# Altium footprint library WARG.PcbLib: 58 footprints (part 2 of 4)
Each footprint in its own frame and in the unit in brackets; x right, y up, seen from the top. Pads: shape width x height; smd on the part's side, far side on the other; paste and mask are expansions set on the pad; w line width, h text height; cw(c..) or ccw(c..) is an arc to the next point about the centre after c.
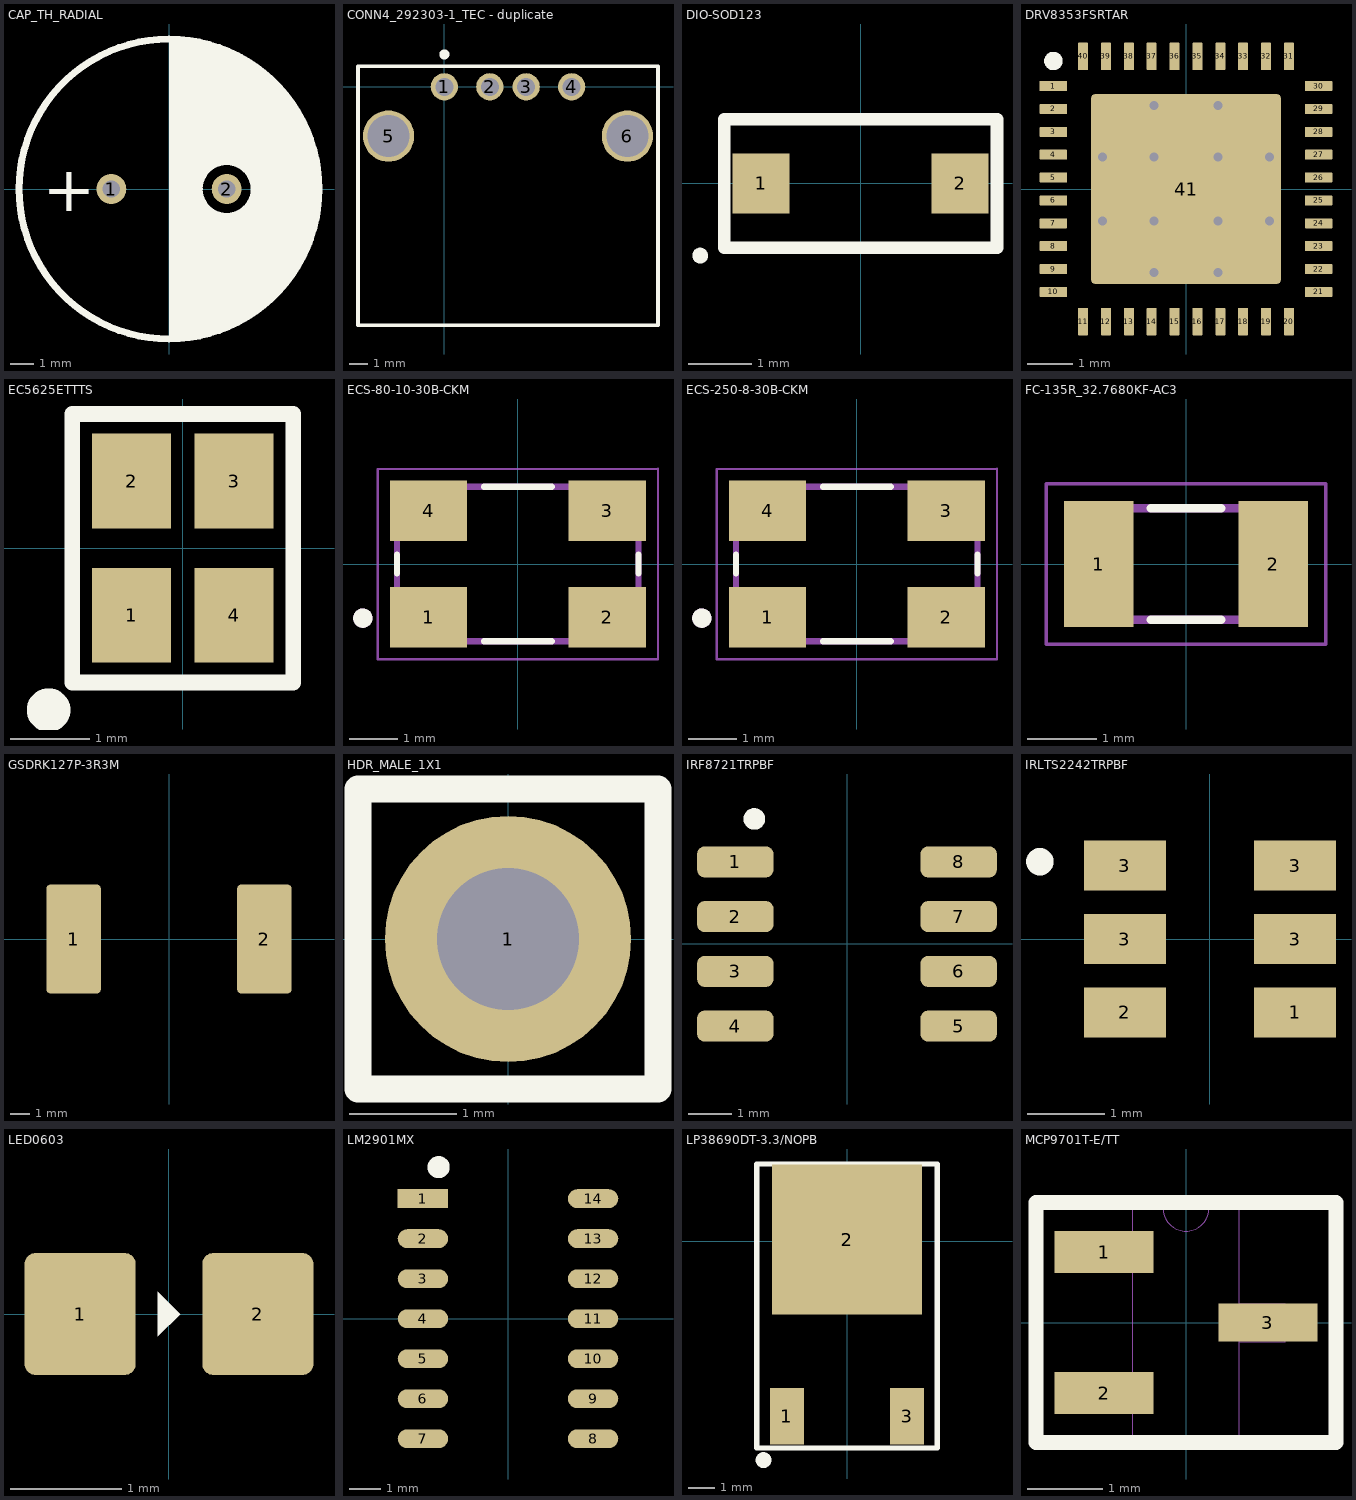
[diagram p1: the footprints below, top view; thin cyan lines are the x and y axes]

## CAP_TH_RADIAL [mm]
pads (2):
  round 1.3 hole 0.75: 1(-2.5,0) 2(2.5,0)
Top Overlay:
  circle w0.3: c0,0 r6.5
  circle w0.3: c2.5,0 r1.187
  region: 4.902,4.166 5.004,-4.013 5.918,-2.997 5.918,-2.667 6.198,-2.388 6.198,-1.93 6.375,-1.753 6.375,-0.584 6.477,-0.483 6.452,-0.457 6.452,0.838 6.274,1.016 6.274,2.108 5.791,2.642 5.766,3.2 5.537,3.429
  region: 0,6.5 0,-6.5 1.374,-6.5 1.651,-6.223 2.159,-6.223 2.413,-5.969
  region: 1.206,0.266 4.064,3.123 4.064,4.953 3.175,5.842 2.794,5.842 2.21,6.223 1.016,6.35 0.866,6.5 0,6.5
  region: 2.067,1.118 4.928,1.118 5.105,1.295 5.055,1.346 5.055,4.166 4.851,4.166 4.064,4.953
  region: 1.295,-0.508 1.956,-1.168 2.235,-1.168 5.004,-3.937 5.004,-4.013 3.607,-5.41 3.429,-5.41 2.87,-5.969 2.413,-5.969
  region: 5.004,-4.013 5.715,-3.302 5.715,0.559 4.216,2.057 3.175,1.219
  region: 2.184,-1.118 4.343,-1.118 5.004,-1.778 5.004,-3.937
  region: 3.708,-0.279 2.997,-0.991 2.997,-1.219 4.267,-1.219 4.394,-1.346
  text "+" at -5.461,-0.968 h2
3D body "User Library-CAPAER_D125_L200_P050_W006X030.STEP": height 20.03, standoff -2.99, extent -6.25,-6.25 6.26,6.25

## CONN4_292303-1_TEC - duplicate [mil]
pads (6):
  round 59 hole 39: 1(0,0) 2(98.43,0) 3(177.17,0) 4(275.59,0)
  round 111 hole 91: 5(-120.87,-106.71) 6(396.46,-106.71)
Top Overlay:
  circle w13.78: c0,70 r4
  lines w7.87: -187.01,-187.01 -187.01,-38.28 -187.01,44.29 462.6,44.29 462.6,-38.28 462.6,-175.14 462.6,-516.71 -187.01,-516.71 -187.01,-175.14
3D body "292303-1--3DModel-STEP-56544.STEP": height 290.46, standoff -161.31, extent -179.91,-510.59 450,40.59
3D body: height 10, standoff 0, extent 0,0 10,10

## DIO-SOD123 [mm]
pads (2):
  rect 0.9x0.95 smd: 1(-1.575,0) 2(1.575,0)
Top Overlay:
  circle w0.15: c-2.54,-1.143 r0.05
  lines w0.2: -2.159,1 -2.159,-1.016 2.159,-1.016 2.159,1.016 -2.159,1.016
3D body "User Library-SOD-123_DiodesInc.step": height 1.46, standoff 0.01, extent -1.925,-0.838 1.925,0.862

## DRV8353FSRTAR [mm]
pads (41):
  rect 0.6x0.22 smd: 1(-2.9,2.25)
  rrect15% 0.6x0.22 smd: 2(-2.9,1.75) 3(-2.9,1.25) 4(-2.9,0.75) 5(-2.9,0.25) 6(-2.9,-0.25) 7(-2.9,-0.75) 8(-2.9,-1.25) 9(-2.9,-1.75) 10(-2.9,-2.25) 21(2.9,-2.25) 22(2.9,-1.75) 23(2.9,-1.25) 24(2.9,-0.75) 25(2.9,-0.25) 26(2.9,0.25) 27(2.9,0.75) 28(2.9,1.25) 29(2.9,1.75) 30(2.9,2.25)
  rrect15% 0.22x0.6 smd: 11(-2.25,-2.9) 12(-1.75,-2.9) 13(-1.25,-2.9) 14(-0.75,-2.9) 15(-0.25,-2.9) 16(0.25,-2.9) 17(0.75,-2.9) 18(1.25,-2.9) 19(1.75,-2.9) 20(2.25,-2.9) 31(2.25,2.9) 32(1.75,2.9) 33(1.25,2.9) 34(0.75,2.9) 35(0.25,2.9) 36(-0.25,2.9) 37(-0.75,2.9) 38(-1.25,2.9) 39(-1.75,2.9) 40(-2.25,2.9)
  rrect4% 4.15x4.15 smd paste-2539.97: 41(0,0)
via 0.7,-0.7 diameter 0.2 hole 0.2
via 0.7,0.7 diameter 0.2 hole 0.2
via 1.825,-0.7 diameter 0.2 hole 0.2
via -0.7,-0.7 diameter 0.2 hole 0.2
via -0.7,0.7 diameter 0.2 hole 0.2
via 1.825,0.7 diameter 0.2 hole 0.2
via -1.825,-0.7 diameter 0.2 hole 0.2
via 0.7,-1.825 diameter 0.2 hole 0.2
via -0.7,-1.825 diameter 0.2 hole 0.2
via 0.7,1.825 diameter 0.2 hole 0.2
via -1.825,0.7 diameter 0.2 hole 0.2
via -0.7,1.825 diameter 0.2 hole 0.2
Top Overlay:
  circle w0.254: c-2.9,2.8 r0.075
Top Paste:
  rectangle: 0.812,-1.982 1.982,-0.812
  rectangle: -0.585,-1.982 0.585,-0.812
  rectangle: -1.982,-1.982 -0.812,-0.812
  rectangle: 0.812,-0.585 1.982,0.585
  rectangle: -1.982,-0.585 -0.812,0.585
  rectangle: -1.982,0.812 -0.812,1.982
  rectangle: 0.812,0.812 1.982,1.982
  rectangle: -0.585,0.812 0.585,1.982
  rectangle: -0.585,-0.585 0.585,0.585
3D body "User Library-QFN40-1.step": height 0.91, standoff 0.01, extent -3,-3 3,3

## EC5625ETTTS [mm] "Footprint for EC5625ETTTS-8.000M TR"
pads (4):
  rect 1x1.2 smd: 1(-0.65,-0.85) 2(-0.65,0.85) 3(0.65,0.85) 4(0.65,-0.85)
Top Overlay:
  circle w0.45: c-1.7,-2.05 r0.05
  lines w0.2: -1.4,-1.7 -1.4,1.7 1.4,1.7 1.4,-1.7 -1.4,-1.7
3D body: height 1, standoff 0, extent -1,-1.25 1,1.25

## ECS-80-10-30B-CKM [mm] "Copy of ECS-250-8-30B-CKM as both share the ECX-53B  SMD CRYSTAL footprint"
pads (4):
  rect 1.6x1.25 smd: 1(-1.85,-1.1) 2(1.85,-1.1) 3(1.85,1.1) 4(-1.85,1.1)
Top Overlay:
  circle w0.2: c-3.21,-1.12 r0.1
  lines w0.127: -2.5,-0.2 -2.5,0.2 ; -0.7,-1.6 0.7,-1.6 ; -0.7,1.6 0.7,1.6 ; 2.5,-0.2 2.5,0.2
Mechanical 13:
  circle w0.2: c-3.21,-1.12 r0.1
  lines w0.127: -2.5,-1.6 -2.5,1.6 2.5,1.6 2.5,-1.6 -2.5,-1.6
Mechanical 15:
  lines w0.05: -2.9,-1.975 -2.9,1.96 2.9,1.975 2.9,-1.975 -2.9,-1.975
3D body "step_temp.STEP": height 0.85, standoff 0, extent -2.5,-1.6 2.5,1.6

## ECS-250-8-30B-CKM [mm]
pads (4):
  rect 1.6x1.25 smd: 1(-1.85,-1.1) 2(1.85,-1.1) 3(1.85,1.1) 4(-1.85,1.1)
Top Overlay:
  circle w0.2: c-3.21,-1.12 r0.1
  lines w0.127: -2.5,-0.2 -2.5,0.2 ; -0.7,-1.6 0.7,-1.6 ; -0.7,1.6 0.7,1.6 ; 2.5,-0.2 2.5,0.2
Mechanical 13:
  circle w0.2: c-3.21,-1.12 r0.1
  lines w0.127: -2.5,-1.6 -2.5,1.6 2.5,1.6 2.5,-1.6 -2.5,-1.6
Mechanical 15:
  lines w0.05: -2.9,-1.975 -2.9,1.96 2.9,1.975 2.9,-1.975 -2.9,-1.975
3D body "step_temp.STEP": height 0.85, standoff 0, extent -2.5,-1.6 2.5,1.6

## FC-135R_32.7680KF-AC3 [mm]
pads (2):
  rect 1x1.8 smd: 1(-1.25,0) 2(1.25,0)
Top Overlay:
  lines w0.127: -0.5,-0.8 0.5,-0.8 ; -0.5,0.8 0.5,0.8
Mechanical 13:
  lines w0.127: -1.65,-0.8 1.65,-0.8 1.65,0.8 -1.65,0.8 -1.65,-0.8
Mechanical 15:
  lines w0.05: -2,-1.15 2,-1.15 2,1.15 -2,1.15 -2,-1.15
3D body "ABS07-32.768KHZ-9.STEP": height 0.91, standoff 0.01, extent -1.6,-0.75 1.6,0.75

## GSDRK127P-3R3M [mm] "IND 3.3UH 9.6A 10M OHM"
pads (2):
  rrect15% 2.8x5.6 smd: 1(-4.9,0) 2(4.9,0)
3D body: height 8, standoff 0, extent -6.25,-6.25 6.25,6.25

## HDR_MALE_1X1 [mm] "CON_1X1_2.54MM_MALE_TH_HDR"
pads (1):
  round 2.3 hole 1.325: 1(0,0)
Top Overlay:
  lines w0.254: -1.4,-1.4 1.4,-1.4 1.4,1.4 -1.4,1.4 -1.4,-1.4
3D body "PREC001SFAN-RC.STEP": height 10.63, standoff -3.04, extent -1.27,-1.27 1.27,1.27

## IRF8721TRPBF [mm]
pads (8):
  rrect50% 1.78x0.72 smd: 1(-2.59,1.905) 2(-2.59,0.635) 3(-2.59,-0.635) 4(-2.59,-1.905) 5(2.59,-1.905) 6(2.59,-0.635) 7(2.59,0.635) 8(2.59,1.905)
Top Overlay:
  circle w0.25: c-2.15,2.9 r0.125
3D body "IRF8721TRPBF.stp": height 1.75, standoff 0, extent -3,-2.45 3,2.45

## IRLTS2242TRPBF [mm] "TSOP-6"
pads (6):
  rect 1.06x0.65 smd: 1(1.1,-0.95) 2(-1.1,-0.95) 3(-1.1,0) 3(-1.1,0.95) 3(1.1,0) 3(1.1,0.95)
Top Overlay:
  circle w0.254: c-2.2,1 r0.05
3D body "PG-TSOP-6-903_INF.step": height 1.45, standoff 0, extent -1.499,-1.499 1.499,1.499

## LED0603 [mm] "Generic LED in 0603 package"
height 0.55
pads (2):
  rrect20% 1x1.1 smd: 1(-0.8,0) 2(0.8,0)
Top Overlay:
  region: -0.1,-0.2 0.1,0 -0.1,0.2
Mechanical 13:
  lines w0.1: -0.875,-0.475 -0.875,0.475 ; 0.875,-0.475 0.875,0.475
3D body "ALSRobot-LED0603(G).step": height 0.6, standoff 0, extent -0.81,-0.4 0.81,0.4

## LM2901MX [mm]
pads (14):
  rect 1.6x0.6 smd: 1(-2.7,3.81)
  oval 1.6x0.6 smd: 2(-2.7,2.54) 3(-2.7,1.27) 4(-2.7,0) 5(-2.7,-1.27) 6(-2.7,-2.54) 7(-2.7,-3.81) 8(2.7,-3.81) 9(2.7,-2.54) 10(2.7,-1.27) 11(2.7,0) 12(2.7,1.27) 13(2.7,2.54) 14(2.7,3.81)
Top Overlay:
  circle w0.5: c-2.2,4.81 r0.1
3D body "NOPB.STEP": height 1.76, standoff 0.01, extent -3,-4.325 3,4.325

## LP38690DT-3.3/NOPB [mm]
pads (3):
  rect 1.3x2.15 smd paste+0 mask+0: 1(-2.285,-6.665) 3(2.285,-6.665)
  rect 5.7x5.7 smd paste+0 mask+0: 2(0,0.051)
Top Overlay:
  circle w0.3: c-3.175,-8.331 r0.15
  lines w0.2: -3.225,-7.873 -3.429,-7.873 ; -3.429,-7.873 -3.429,2.929 3.429,2.929 3.429,-7.873 -3.429,-7.873
3D body: height 0.25, standoff 0, extent 0,0 0.254,0.254
3D body "NDP0003B.stp": height 2.3, standoff -0.17, extent -3.29,-7.155 3.29,2.755

## MCP9701T-E/TT [mil]
pads (3):
  rect 52x22 smd: 1(-43,37) 2(-43,-37)
  rect 52x20 smd: 3(43,0)
Top Overlay:
  lines w7.87: -78.74,-62.99 -78.74,-47.24 -78.74,52.17 -78.74,62.99 -39.37,62.99 32.48,62.99 65.94,62.99 78.74,62.99 78.74,42.32 78.74,0.98 78.74,-52.17 78.74,-62.99 48.23,-62.99 -33.46,-62.99 -62.99,-62.99 -78.74,-62.99
Mechanical 13:
  lines w0: -28,-47 -52,-47 -52,-28 -28,-28 ; -28,-47 -28,-28 ; -28,-47 -28,-60 28,-60 28,-10 ; -28,-28 -28,28 ; -28,28 -52,28 -52,47 -28,47 ; -28,28 -28,47 ; -28,47 -28,60 -12,60 ; -12,60 ccw(c0,60) 12,60 ; -12,60 12,60 ; 12,60 28,60 28,10 ; 28,-10 52,-10 52,10 28,10 ; 28,-10 28,10
3D body "IRLML2060TRPBF.STEP": height 44.6, standoff 0.5, extent -49.41,-57.48 49.41,57.48